# Altium footprint library ublox TOBY-LISA-SARA.PcbLib: 1 footprints
Each footprint in its own frame and in the unit in brackets; x right, y up, seen from the top. Pads: shape width x height; smd on the part's side, far side on the other; paste and mask are expansions set on the pad; w line width, h text height; cw(c..) or ccw(c..) is an arc to the next point about the centre after c.
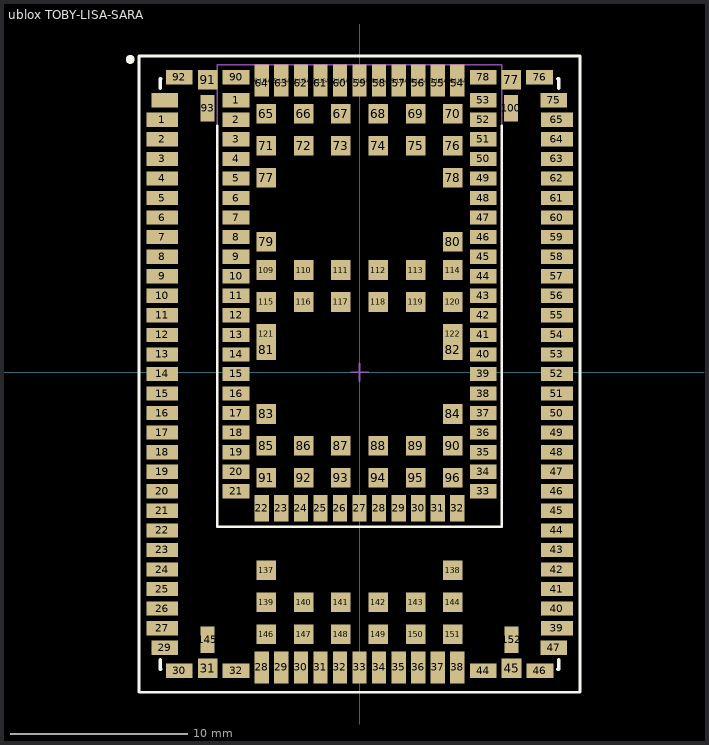
[diagram p0: the footprint, top view; thin cyan lines are the x and y axes]

## ublox TOBY-LISA-SARA [mm] "Nested design for TOBY, LISA and SARA Cellular Modules"
height 3.25
pads (220):
  rect 1.8x0.8 smd paste-10: 1(-11.1,14.2) 2(-11.1,13.1) 3(-11.1,12) 4(-11.1,10.9) 5(-11.1,9.8) 6(-11.1,8.7) 7(-11.1,7.6) 8(-11.1,6.5) 9(-11.1,5.4) 10(-11.1,4.3) 11(-11.1,3.2) 12(-11.1,2.1) 13(-11.1,1) 14(-11.1,-0.1) 15(-11.1,-1.2) 16(-11.1,-2.3) 17(-11.1,-3.4) 18(-11.1,-4.5) 19(-11.1,-5.6) 20(-11.1,-6.7) 21(-11.1,-7.8) 22(-11.1,-8.9) 23(-11.1,-10) 24(-11.1,-11.1) 25(-11.1,-12.2) 26(-11.1,-13.3) 27(-11.1,-14.4) 39(11.1,-14.4) 40(11.1,-13.3) 41(11.1,-12.2) 42(11.1,-11.1) 43(11.1,-10) 44(11.1,-8.9) 45(11.1,-7.8) 46(11.1,-6.7) 47(11.1,-5.6) 48(11.1,-4.5) 49(11.1,-3.4) 50(11.1,-2.3) 51(11.1,-1.2) 52(11.1,-0.1) 53(11.1,1) 54(11.1,2.1) 55(11.1,3.2) 56(11.1,4.3) 57(11.1,5.4) 58(11.1,6.5) 59(11.1,7.6) 60(11.1,8.7) 61(11.1,9.8) 62(11.1,10.9) 63(11.1,12) 64(11.1,13.1) 65(11.1,14.2)
  rect 1.5x0.8 smd paste-1: 1(-6.95,15.3) 2(-6.95,14.2) 3(-6.95,13.1) 4(-6.95,12) 5(-6.95,10.9) 6(-6.95,9.8) 7(-6.95,8.7) 8(-6.95,7.6) 9(-6.95,6.5) 10(-6.95,5.4) 11(-6.95,4.3) 12(-6.95,3.2) 13(-6.95,2.1) 14(-6.95,1) 15(-6.95,-0.1) 16(-6.95,-1.2) 17(-6.95,-2.3) 18(-6.95,-3.4) 19(-6.95,-4.5) 20(-6.95,-5.6) 21(-6.95,-6.7) 33(6.95,-6.7) 34(6.95,-5.6) 35(6.95,-4.5) 36(6.95,-3.4) 37(6.95,-2.3) 38(6.95,-1.2) 39(6.95,-0.1) 40(6.95,1) 41(6.95,2.1) 42(6.95,3.2) 43(6.95,4.3) 44(6.95,5.4) 45(6.95,6.5) 46(6.95,7.6) 47(6.95,8.7) 48(6.95,9.8) 49(6.95,10.9) 50(6.95,12) 51(6.95,13.1) 52(6.95,14.2) 53(6.95,15.3)
  rect 1.5x0.8 smd paste-2.222 mask+0.05: 1-TOBY(-10.95,15.3) 29(-10.95,-15.5) 47(10.925,-15.5) 75(10.925,15.3)
  rect 0.8x1.5 smd paste-1: 22(-5.5,-7.65) 23(-4.4,-7.65) 24(-3.3,-7.65) 25(-2.2,-7.65) 26(-1.1,-7.65) 27(0,-7.65) 28(1.1,-7.65) 29(2.2,-7.65) 30(3.3,-7.65) 31(4.4,-7.65) 32(5.5,-7.65) 54(5.5,16.25) 55(4.4,16.25) 56(3.3,16.25) 57(2.2,16.25) 58(1.1,16.25) 59(0,16.25) 60(-1.1,16.25) 61(-2.2,16.25) 62(-3.3,16.25) 63(-4.4,16.25) 64(-5.5,16.25)
  rect 0.8x1.8 smd paste-10: 28(-5.5,-16.6) 29(-4.4,-16.6) 30(-3.3,-16.6) 31(-2.2,-16.6) 32(-1.1,-16.6) 33(0,-16.6) 34(1.1,-16.6) 35(2.2,-16.6) 36(3.3,-16.6) 37(4.4,-16.6) 38(5.5,-16.6) 66-LISA(5.5,16.4) 67-LISA(4.4,16.4) 68-LISA(3.3,16.4) 69-LISA(2.2,16.4) 70-LISA(1.1,16.4) 71-LISA(0,16.4) 72-LISA(-1.1,16.4) 73-LISA(-2.2,16.4) 74-LISA(-3.3,16.4) 75-LISA(-4.4,16.4) 76-LISA(-5.5,16.4)
  rect 1.5x0.8 smd paste-4.444 mask+0.05: 30(-10.15,-16.8) 32(-6.95,-16.8) 44(6.95,-16.8) 46(10.15,-16.8) 76(10.125,16.6) 78(6.95,16.6) 90(-6.95,16.6) 92(-10.15,16.6)
  rect 1.1x1.1 smd paste-4.444 mask+0.05: 31(-8.55,-16.65) 45(8.55,-16.65) 77(8.525,16.45) 91(-8.55,16.45)
  rect 1.1x1.1 smd paste-0.025: 65(-5.25,14.55) 66(-3.15,14.55) 67(-1.05,14.55) 68(1.05,14.55) 69(3.15,14.55) 70(5.25,14.55) 71(-5.25,12.75) 72(-3.15,12.75) 73(-1.05,12.75) 74(1.05,12.75) 75(3.15,12.75) 76(5.25,12.75) 77(-5.25,10.95) 78(5.25,10.95) 79(-5.25,7.35) 80(5.25,7.35) 81(-5.25,1.25) 82(5.25,1.25) 83(-5.25,-2.35) 84(5.25,-2.35) 85(-5.25,-4.15) 86(-3.15,-4.15) 87(-1.05,-4.15) 88(1.05,-4.15) 89(3.15,-4.15) 90(5.25,-4.15) 91(-5.25,-5.95) 92(-3.15,-5.95) 93(-1.05,-5.95) 94(1.05,-5.95) 95(3.15,-5.95) 96(5.25,-5.95)
  rect 0.8x1.5 smd paste-4.444 mask+0.05: 93(-8.55,14.85) 100(8.525,14.85) 145(-8.55,-15.05) 152(8.55,-15.05)
  rect 1.1x1.1 smd paste-3.333 mask+0.05: 109(-5.25,5.75) 110(-3.15,5.75) 111(-1.05,5.75) 112(1.05,5.75) 113(3.15,5.75) 114(5.25,5.75) 115(-5.25,3.95) 116(-3.15,3.95) 117(-1.05,3.95) 118(1.05,3.95) 119(3.15,3.95) 120(5.25,3.95) 121(-5.25,2.15) 122(5.25,2.15) 137(-5.25,-11.15) 138(5.25,-11.15) 139(-5.25,-12.95) 140(-3.15,-12.95) 141(-1.05,-12.95) 142(1.05,-12.95) 143(3.15,-12.95) 144(5.25,-12.95) 146(-5.25,-14.75) 147(-3.15,-14.75) 148(-1.05,-14.75) 149(1.05,-14.75) 150(3.15,-14.75) 151(5.25,-14.75)
Top Overlay:
  circle w0.25: c-12.9,17.6 r0.125
  lines w0.15: -8,13.85 -8,-8.7 8,-8.7 8,13.85
  lines w0.16: -12.402,-17.989 -12.402,17.799 12.382,17.799 ; -12.39,-18.002 12.388,-18.002 ; 12.401,-17.989 12.401,17.78
  lines w0.2: -11.225,-16.175 -11.225,-16.7 -11.175,-16.7 ; -11.225,15.975 -11.225,16.5 -11.175,16.5 ; 11.15,-16.7 11.2,-16.7 11.2,-16.175 ; 11.15,16.5 11.2,16.5 11.2,15.975
Top Paste:
  rectangle: -7.775,14.925 -6.225,15.675
  rectangle: -7.775,13.825 -6.225,14.575
  rectangle: -7.775,12.725 -6.225,13.475
  rectangle: -7.775,11.625 -6.225,12.375
  rectangle: -7.775,10.525 -6.225,11.275
  rectangle: -7.775,9.425 -6.225,10.175
  rectangle: -7.775,8.325 -6.225,9.075
  rectangle: -7.775,7.225 -6.225,7.975
  rectangle: -7.775,6.125 -6.225,6.875
  rectangle: -7.775,5.025 -6.225,5.775
  rectangle: -7.775,3.925 -6.225,4.675
  rectangle: -7.775,2.825 -6.225,3.575
  rectangle: -7.775,1.725 -6.225,2.475
  rectangle: -7.775,0.625 -6.225,1.375
  rectangle: -7.775,-0.475 -6.225,0.275
  rectangle: -7.775,-1.575 -6.225,-0.825
  rectangle: -7.775,-2.675 -6.225,-1.925
  rectangle: -7.775,-3.775 -6.225,-3.025
  rectangle: -7.775,-4.875 -6.225,-4.125
  rectangle: -7.775,-5.975 -6.225,-5.225
  rectangle: -7.775,-7.075 -6.225,-6.325
  region: -5.125,-8.475 -5.125,-6.925 -5.875,-6.925 -5.875,-8.475
  region: -4.025,-8.475 -4.025,-6.925 -4.775,-6.925 -4.775,-8.475
  region: -2.925,-8.475 -2.925,-6.925 -3.675,-6.925 -3.675,-8.475
  region: -1.825,-8.475 -1.825,-6.925 -2.575,-6.925 -2.575,-8.475
  region: -0.725,-8.475 -0.725,-6.925 -1.475,-6.925 -1.475,-8.475
  region: 0.375,-8.475 0.375,-6.925 -0.375,-6.925 -0.375,-8.475
  region: 1.475,-8.475 1.475,-6.925 0.725,-6.925 0.725,-8.475
  region: 2.575,-8.475 2.575,-6.925 1.825,-6.925 1.825,-8.475
  region: 3.675,-8.475 3.675,-6.925 2.925,-6.925 2.925,-8.475
  region: 4.775,-8.475 4.775,-6.925 4.025,-6.925 4.025,-8.475
  region: 5.875,-8.475 5.875,-6.925 5.125,-6.925 5.125,-8.475
  rectangle: 6.225,-7.075 7.775,-6.325
  rectangle: 6.225,-5.975 7.775,-5.225
  rectangle: 6.225,-4.875 7.775,-4.125
  rectangle: 6.225,-3.775 7.775,-3.025
  rectangle: 6.225,-2.675 7.775,-1.925
  rectangle: 6.225,-1.575 7.775,-0.825
  rectangle: 6.225,-0.475 7.775,0.275
  rectangle: 6.225,0.625 7.775,1.375
  rectangle: 6.225,1.725 7.775,2.475
  rectangle: 6.225,2.825 7.775,3.575
  rectangle: 6.225,3.925 7.775,4.675
  rectangle: 6.225,5.025 7.775,5.775
  rectangle: 6.225,6.125 7.775,6.875
  rectangle: 6.225,7.225 7.775,7.975
  rectangle: 6.225,8.325 7.775,9.075
  rectangle: 6.225,9.425 7.775,10.175
  rectangle: 6.225,10.525 7.775,11.275
  rectangle: 6.225,11.625 7.775,12.375
  rectangle: 6.225,12.725 7.775,13.475
  rectangle: 6.225,13.825 7.775,14.575
  rectangle: 6.225,14.925 7.775,15.675
  region: 4.775,15.525 4.775,17.075 4.025,17.075 4.025,15.525
  region: 3.675,15.525 3.675,17.075 2.925,17.075 2.925,15.525
  region: 2.575,15.525 2.575,17.075 1.825,17.075 1.825,15.525
  region: 5.875,15.525 5.875,17.075 5.125,17.075 5.125,15.525
  region: 1.475,15.525 1.475,17.075 0.725,17.075 0.725,15.525
  region: 0.375,15.525 0.375,17.075 -0.375,17.075 -0.375,15.525
  region: -0.725,15.525 -0.725,17.075 -1.475,17.075 -1.475,15.525
  region: -1.825,15.525 -1.825,17.075 -2.575,17.075 -2.575,15.525
  region: -2.925,15.525 -2.925,17.075 -3.675,17.075 -3.675,15.525
  region: -4.025,15.525 -4.025,17.075 -4.775,17.075 -4.775,15.525
  region: -5.125,15.525 -5.125,17.075 -5.875,17.075 -5.875,15.525
Mechanical 11:
  lines w0.1: -0.5,0 0.5,0 ; 0,-0.5 0,0.5
Mechanical 15:
  lines w0.1: -12.4,-18 -12.4,17.8 12.4,17.8 12.4,-18 -12.4,-18 ; -8,-8.7 8,-8.7 8,17.3 -8,17.3 -8,-8.7
3D body "ublox SARA.step": height 3.03, standoff 0.03, extent -8,-8.7 8,17.3
3D body "ublox LISA.step": height 2.63, standoff 0.03, extent -11.2,-16.8 11.2,16.6
3D body "TOBY.STEP": height 2.6, standoff 0, extent -12.4,-18 12.4,17.8